# Altium footprint library 430 integreted.PcbLib: 281 footprints (part 11 of 18)
Each footprint in its own frame and in the unit in brackets; x right, y up, seen from the top. Pads: shape width x height; smd on the part's side, far side on the other; paste and mask are expansions set on the pad; w line width, h text height; cw(c..) or ccw(c..) is an arc to the next point about the centre after c.
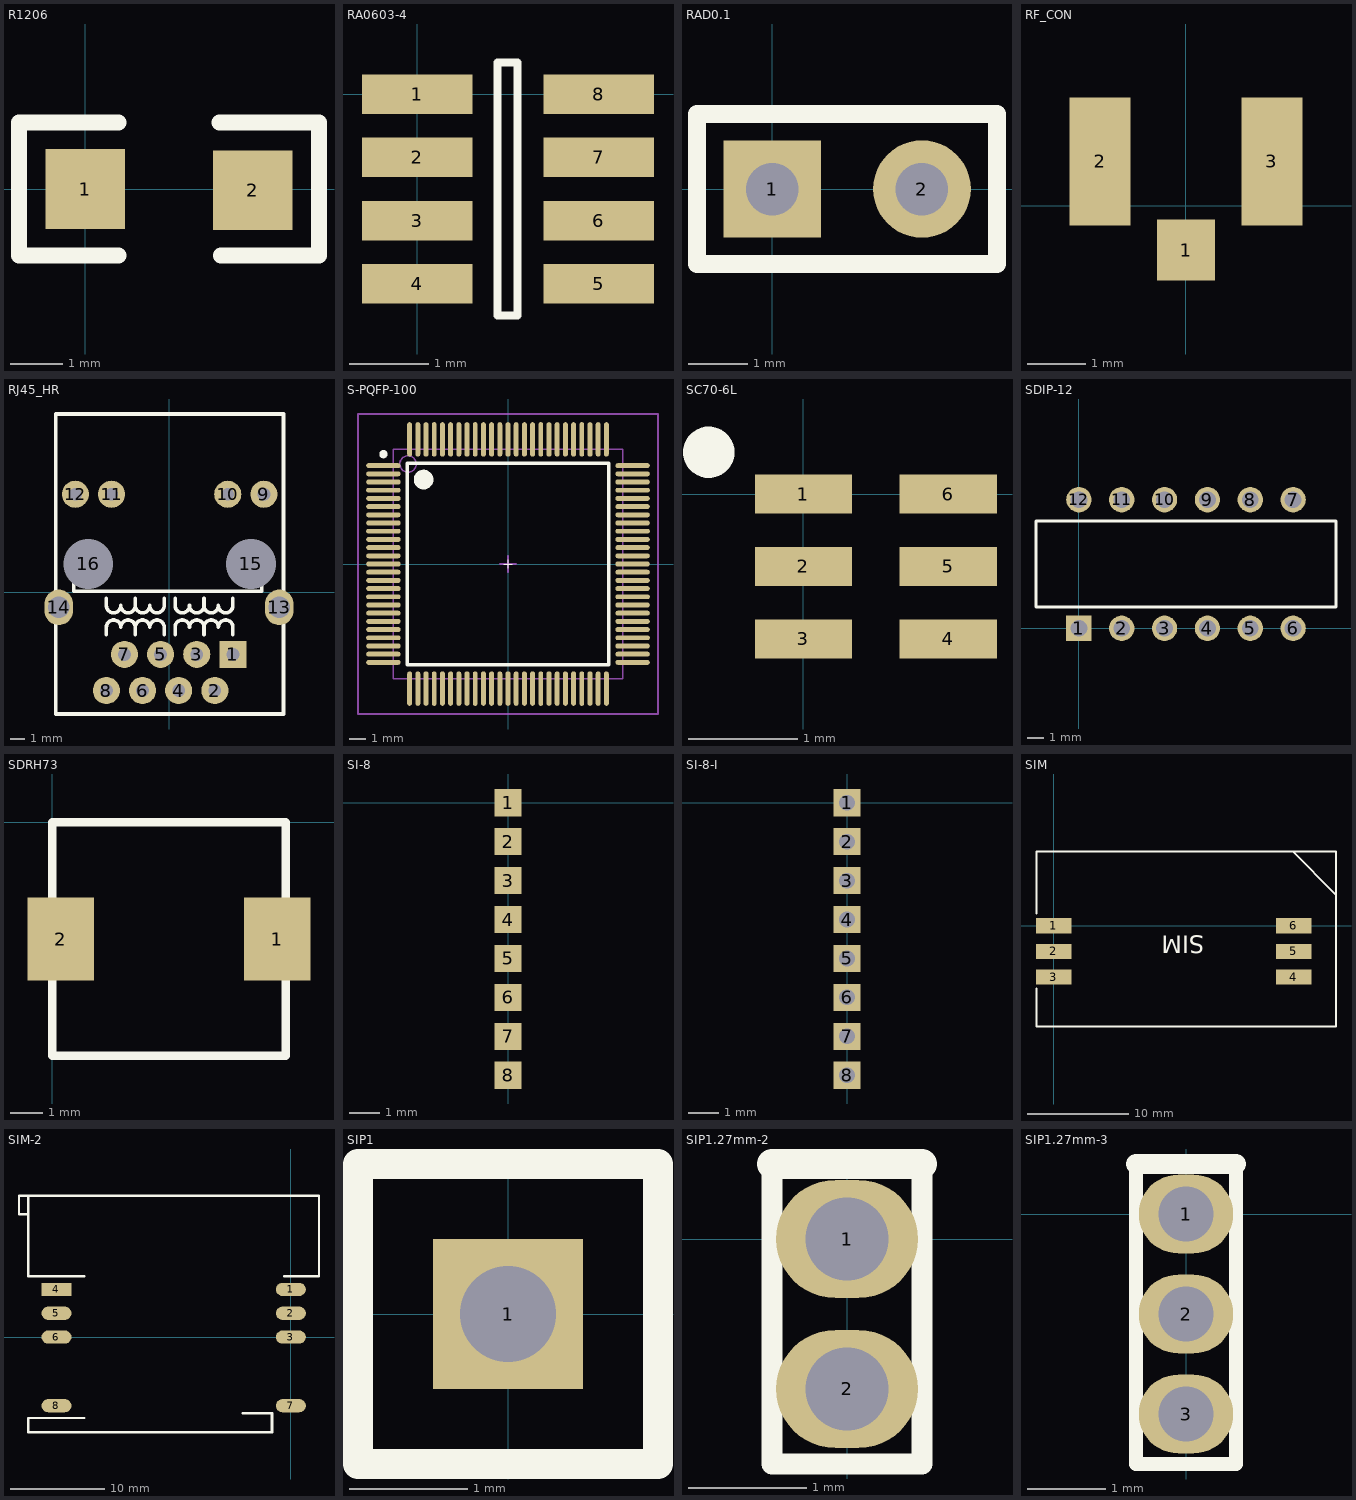
[diagram p10: the footprints below, top view; thin cyan lines are the x and y axes]

## R1206 [mil]
pads (2):
  rect 60x60 smd: 1(0,0) 2(126,-1)
Top Overlay:
  lines w12: 25,-50 -50,-50 -50,50 25,50 ; 101,50 176,50 176,-50 102,-50
3D body: height 23.62, standoff 0, extent 0.01,-32.49 126,30.5

## RA0603-4 [mm]
pads (8):
  rect 1.4x0.5 smd: 1(0,0) 2(0,-0.8) 3(0,-1.6) 4(0,-2.4) 5(2.3,-2.4) 6(2.3,-1.6) 7(2.3,-0.8) 8(2.3,0)
Top Overlay:
  lines w0.1: 1.016,-2.8 1.27,-2.8 1.27,0.4 1.016,0.4 1.016,-2.8

## RAD0.1 [mil]
pads (2):
  rect 65x65 hole 35: 1(0,0)
  round 65 hole 35: 2(100,0)
Top Overlay:
  lines w12: -50,-50 -50,50 150,50 150,-50 -50,-50

## RF_CON [mm]
pads (3):
  rect 1x1.05 smd: 1(0,-0.763)
  rect 1.05x2.2 smd: 2(-1.475,0.763) 3(1.475,0.763)
3D body: height 1.25, standoff -0.01, extent -1.448,-0.788 1.552,2.312

## RJ45_HR [mm]
pads (16):
  rect 1.905x1.905 hole 0.9: 1(4.49,-4.355)
  round 1.905 hole 0.9: 2(3.22,-6.895) 3(1.95,-4.355) 4(0.68,-6.895) 5(-0.59,-4.355) 6(-1.86,-6.895) 7(-3.13,-4.355) 8(-4.4,-6.895) 9(6.67,6.895) 10(4.13,6.895) 11(-4.04,6.895) 12(-6.58,6.895)
  oval 2x2.5 hole 1.5: 13(7.74,-1.055) 14(-7.74,-1.055)
  round 3.302 hole 3.5: 15(5.76,1.995) 16(-5.67,1.995)
Top Overlay:
  lines w0.254: -6.686,0.598 -6.686,0.09 6.522,0.09 6.522,0.598 ; -4.4,-2.958 -4.4,-2.45 cw(c-3.892,-2.45) -3.384,-2.45 cw(c-2.876,-2.45) -2.368,-2.45 ; -4.4,-0.418 -4.4,-0.926 ccw(c-3.892,-0.926) -3.384,-0.926 ccw(c-2.876,-0.926) -2.368,-0.926 ; -2.368,-2.958 -2.368,-2.45 ; -2.368,-0.418 -2.368,-0.926 ; -0.336,-2.958 -0.336,-2.45 ccw(c-0.844,-2.45) -1.352,-2.45 ccw(c-1.86,-2.45) -2.368,-2.45 ; -0.336,-0.418 -0.336,-0.926 cw(c-0.844,-0.926) -1.352,-0.926 cw(c-1.86,-0.926) -2.368,-0.926 ; 0.426,-2.958 0.426,-2.45 cw(c0.934,-2.45) 1.442,-2.45 cw(c1.95,-2.45) 2.458,-2.45 ; 0.426,-0.418 0.426,-0.926 ccw(c0.934,-0.926) 1.442,-0.926 ccw(c1.95,-0.926) 2.458,-0.926 ; 2.458,-2.958 2.458,-2.45 ; 2.458,-0.418 2.458,-0.926 ; 4.49,-2.958 4.49,-2.45 ccw(c3.982,-2.45) 3.474,-2.45 ccw(c2.966,-2.45) 2.458,-2.45 ; 4.49,-0.418 4.49,-0.926 cw(c3.982,-0.926) 3.474,-0.926 cw(c2.966,-0.926) 2.458,-0.926 ; -7.956,-8.546 8.046,-8.546 8.046,12.534 -7.956,12.534 -7.956,-8.546
3D body: height 1.5, standoff -15, extent -7.864,-8.479 8.016,12.921

## S-PQFP-100 [mm]
pads (100):
  oval 2.1x0.3 smd: 1(-7.6,6) 2(-7.6,5.5) 3(-7.6,5) 4(-7.6,4.5) 5(-7.6,4) 6(-7.6,3.5) 7(-7.6,3) 8(-7.6,2.5) 9(-7.6,2) 10(-7.6,1.5) 11(-7.6,1) 12(-7.6,0.5) 13(-7.6,0) 14(-7.6,-0.5) 15(-7.6,-1) 16(-7.6,-1.5) 17(-7.6,-2) 18(-7.6,-2.5) 19(-7.6,-3) 20(-7.6,-3.5) 21(-7.6,-4) 22(-7.6,-4.5) 23(-7.6,-5) 24(-7.6,-5.5) 25(-7.6,-6) 51(7.6,-6) 52(7.6,-5.5) 53(7.6,-5) 54(7.6,-4.5) 55(7.6,-4) 56(7.6,-3.5) 57(7.6,-3) 58(7.6,-2.5) 59(7.6,-2) 60(7.6,-1.5) 61(7.6,-1) 62(7.6,-0.5) 63(7.6,0) 64(7.6,0.5) 65(7.6,1) 66(7.6,1.5) 67(7.6,2) 68(7.6,2.5) 69(7.6,3) 70(7.6,3.5) 71(7.6,4) 72(7.6,4.5) 73(7.6,5) 74(7.6,5.5) 75(7.6,6)
  oval 0.3x2.1 smd: 26(-6,-7.6) 27(-5.5,-7.6) 28(-5,-7.6) 29(-4.5,-7.6) 30(-4,-7.6) 31(-3.5,-7.6) 32(-3,-7.6) 33(-2.5,-7.6) 34(-2,-7.6) 35(-1.5,-7.6) 36(-1,-7.6) 37(-0.5,-7.6) 38(0,-7.6) 39(0.5,-7.6) 40(1,-7.6) 41(1.5,-7.6) 42(2,-7.6) 43(2.5,-7.6) 44(3,-7.6) 45(3.5,-7.6) 46(4,-7.6) 47(4.5,-7.6) 48(5,-7.6) 49(5.5,-7.6) 50(6,-7.6) 76(6,7.6) 77(5.5,7.6) 78(5,7.6) 79(4.5,7.6) 80(4,7.6) 81(3.5,7.6) 82(3,7.6) 83(2.5,7.6) 84(2,7.6) 85(1.5,7.6) 86(1,7.6) 87(0.5,7.6) 88(0,7.6) 89(-0.5,7.6) 90(-1,7.6) 91(-1.5,7.6) 92(-2,7.6) 93(-2.5,7.6) 94(-3,7.6) 95(-3.5,7.6) 96(-4,7.6) 97(-4.5,7.6) 98(-5,7.6) 99(-5.5,7.6) 100(-6,7.6)
Top Overlay:
  circle w0.6: c-5.15,5.15 r0.3
  circle w0.25: c-7.6,6.7 r0.125
  lines w0.025: -0.254,0 0.254,0 ; 0,-0.254 0,0.254
  lines w0.2: -6.15,-6.15 6.15,-6.15 6.15,6.15 -6.15,6.15 -6.15,-6.15
Mechanical 13:
  circle w0.1: c-6.1,6.1 r0.5
  lines w0.1: -7,-7 7,-7 7,7 -7,7 -7,-7
Mechanical 15:
  lines w0.1: -0.5,0 0.5,0 ; 0,-0.5 0,0.5 ; -9.15,-9.15 9.15,-9.15 9.15,9.15 -9.15,9.15 -9.15,-9.15
3D body: height 1.6, standoff 0, extent -8,-8 8,8

## SC70-6L [mil]
pads (6):
  rect 35x14 smd: 1(0,0) 2(0,-26) 3(0,-52) 4(52,-52) 5(52,-26) 6(52,0)
Top Overlay:
  circle w10: c-34,15 r4.24

## SDIP-12 [mm]
pads (12):
  rect 1.5x1.5 hole 1: 1(0,0)
  round 1.5 hole 1: 2(2.54,0) 3(5.08,0) 4(7.62,0) 5(10.16,0) 6(12.7,0) 7(12.7,7.62) 8(10.16,7.62) 9(7.62,7.62) 10(5.08,7.62) 11(2.54,7.62) 12(0,7.62)
Top Overlay:
  lines w0.178: -2.54,1.27 15.24,1.27 15.24,6.35 -1.27,6.35 -2.54,6.35 -2.54,1.27

## SDRH73 [mil]
pads (2):
  rect 80x100 smd: 1(270,-140) 2(10,-140)
Top Overlay:
  lines w10: 0,-280 0,0 280,0 280,-280 0,-280

## SI-8 [mil] "SI-8"
pads (8):
  rect 35x35 smd: 1(0,0) 2(0,-50) 3(0,-100) 4(0,-150) 5(0,-200) 6(0,-250) 7(0,-300) 8(0,-350)

## SI-8-I [mil] "SI-8-I"
pads (8):
  rect 35x35 hole 20: 1(0,0) 2(0,-50) 3(0,-100) 4(0,-150) 5(0,-200) 6(0,-250) 7(0,-300) 8(0,-350)

## SIM [mm]
pads (6):
  rect 3.5x1.5 smd: 1(0,0) 2(0,-2.54) 3(0,-5.08) 4(23.8,-5.08) 5(23.8,-2.54) 6(23.8,0)
Top Overlay:
  lines w0.178: -1.7,-6.2 -1.7,-10 28,-10 28,7.38 -1.7,7.38 -1.7,1.2 ; 23.7,7.38 27.94,3.14
  text "SIM" at 14.925,-0.375 h3

## SIM-2 [mm]
pads (8):
  oval 3.2x1.4 smd: 1(0,5.08) 2(0,2.54) 3(0,0) 5(-25,2.54) 6(-25,0) 7(0,-7.32) 8(-25,-7.32)
  rect 3.2x1.4 smd: 4(-25,5.08)
Top Overlay:
  lines w0.254: -28,13.08 -29,13.08 -29,15.08 3,15.08 3,6.477 -0.695,6.477 ; -28,15.08 -28,6.502 -22.031,6.502 ; -22.056,-8.636 -28,-8.636 -28,-10.16 -2.025,-10.16 ; -5.165,-8.128 -1.99,-8.128 ; -2.025,-8.128 -2.025,-10.16 ; -2,-8.128 -2,-10.16 -2.025,-10.16

## SIP1 [mil]
pads (1):
  rect 50x50 hole 32 square: 1(0,0)
Top Overlay:
  lines w10: -50,-50 -50,50 50,50 50,-50 -50,-50

## SIP1.27mm-2 [mm]
pads (2):
  oval 1.2x1 hole 0.7: 1(0,0) 2(0,-1.27)
Top Overlay:
  lines w0.178: -0.635,0.635 -0.635,-1.905 0.635,-1.905 0.635,0.635
  lines w0.254: -0.635,0.635 0.635,0.635

## SIP1.27mm-3 [mm]
pads (3):
  oval 1.2x1 hole 0.7: 1(0,0) 2(0,-1.27) 3(0,-2.54)
Top Overlay:
  lines w0.178: -0.635,0.635 -0.635,-3.175 0.635,-3.175 0.635,0.635
  lines w0.254: -0.635,0.635 0.635,0.635